# Altium footprint library 1.10-电容.PcbLib: 186 footprints (part 9 of 12)
Each footprint in its own frame and in the unit in brackets; x right, y up, seen from the top. Pads: shape width x height; smd on the part's side, far side on the other; paste and mask are expansions set on the pad; w line width, h text height; cw(c..) or ccw(c..) is an arc to the next point about the centre after c.
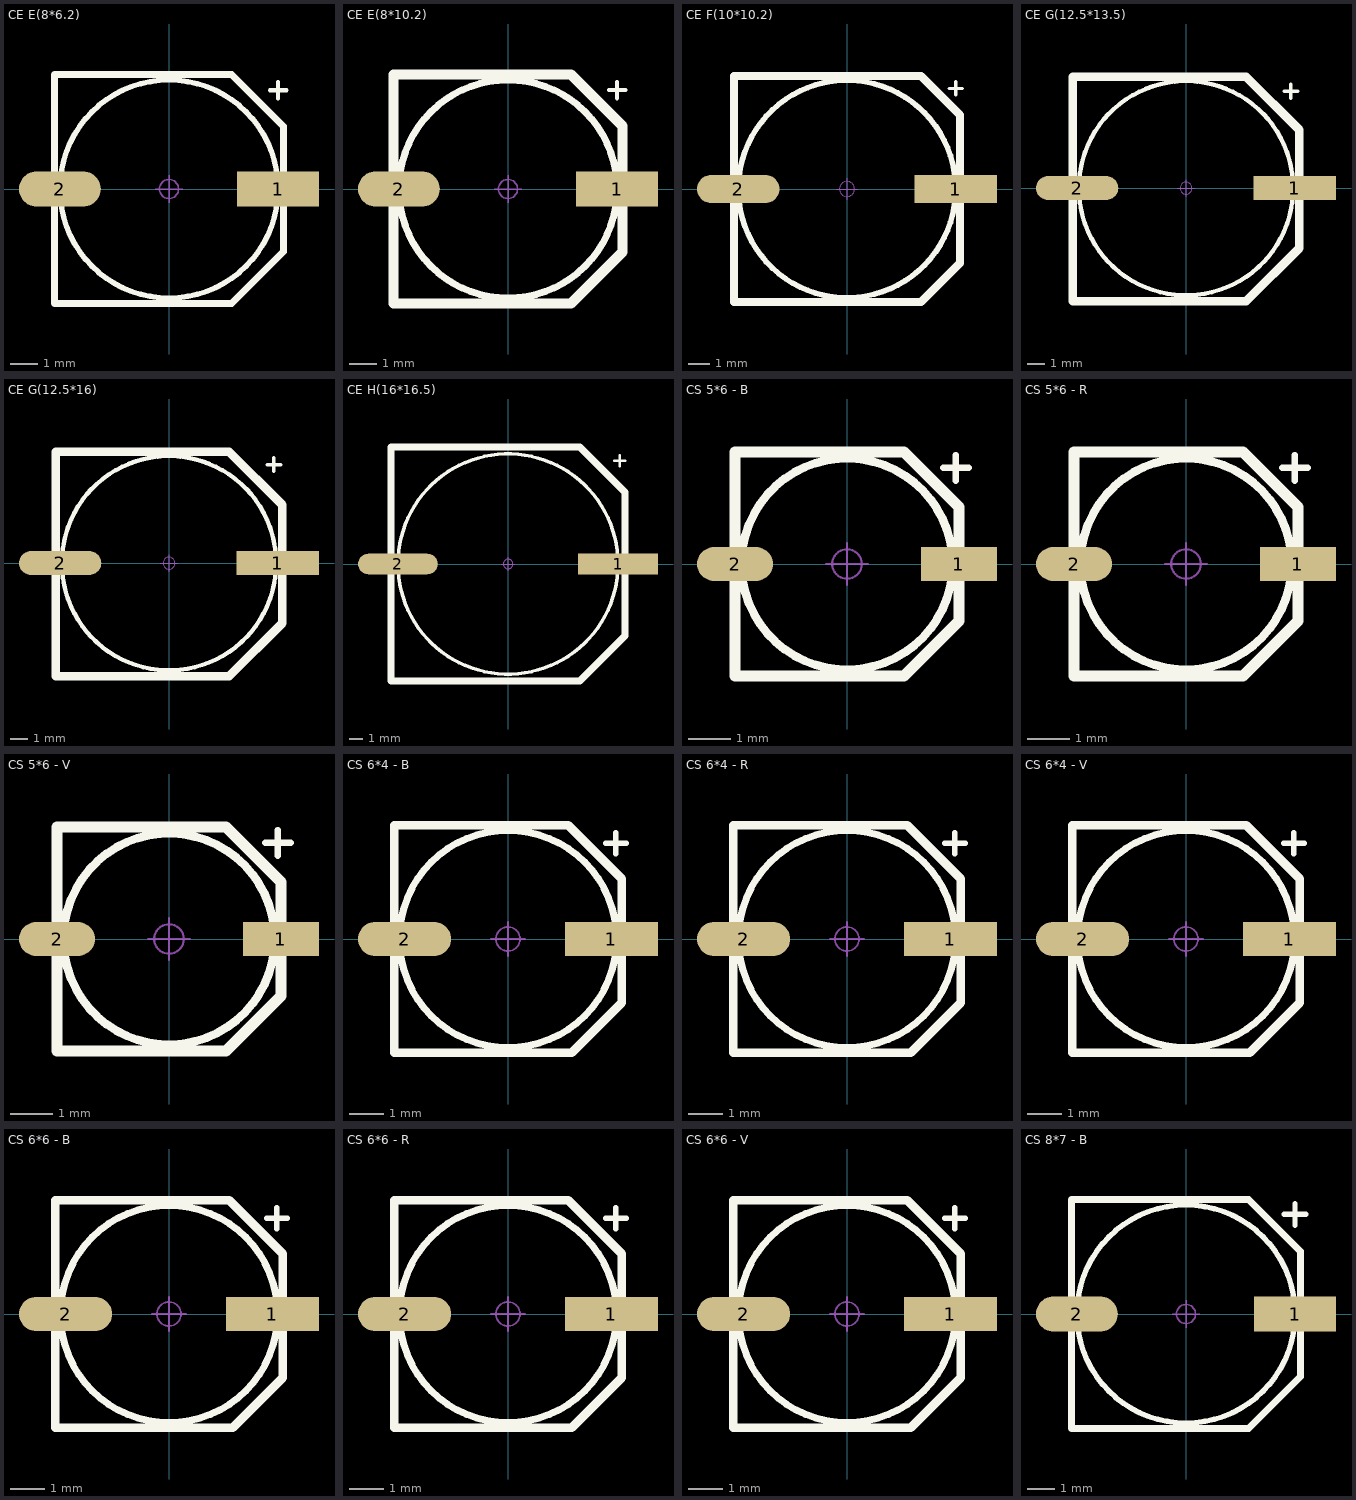
[diagram p8: the footprints below, top view; thin cyan lines are the x and y axes]

## CE E(8*6.2) [mm] "贴片电解电容，直径8mm，高6.2mm      [ PCB学习群514746572 ]"
pads (2):
  rect 3x1.3 smd: 1(4,0)
  oval 3x1.3 smd: 2(-4,0)
Top Overlay:
  circle w0.2: c0,0 r4
  lines w0.152: 3.704,3.623 4.304,3.623 ; 4,3.323 4,3.927
  lines w0.254: -4.2,-4.2 -4.2,4.2 2.3,4.2 4.2,2.3 4.2,-2.3 2.3,-4.2 -4.2,-4.2
Mechanical 15:
  circle w0.05: c0,0 r0.35
  lines w0.05: -0.5,0 0.5,0 ; 0,-0.5 0,0.5
3D body "CE_SMD_e_8x6_2.STEP": height 6.25, standoff 0.04, extent -4.5,-4.15 4.5,4.15

## CE E(8*10.2) [mm] "贴片电解电容，直径8mm，高10.2mm      [ PCB学习群514746572 ]"
pads (2):
  rect 3x1.3 smd: 1(4,0)
  oval 3x1.3 smd: 2(-4,0)
Top Overlay:
  circle w0.254: c0,0 r4
  lines w0.152: 3.704,3.625 4.304,3.625 ; 4,3.325 4,3.929
  lines w0.381: -4.2,-4.2 -4.2,4.2 2.3,4.2 4.2,2.3 4.2,-2.3 2.3,-4.2 -4.2,-4.2
Mechanical 15:
  circle w0.05: c0,0 r0.35
  lines w0.05: -0.5,0 0.5,0 ; 0,-0.5 0,0.5
3D body "CE_SMD_e_8x10_2.STEP": height 10.25, standoff 0.04, extent -4.5,-4.15 4.5,4.15

## CE F(10*10.2) [mm] "贴片电解电容，直径10mm，高10.2mm      [ PCB学习群514746572 ]"
pads (2):
  rect 3.8x1.3 smd: 1(5,0)
  oval 3.8x1.3 smd: 2(-5,0)
Top Overlay:
  circle w0.254: c0,0 r5
  lines w0.152: 4.704,4.625 5.304,4.625 ; 5,4.325 5,4.929
  lines w0.381: 5.191,-3.413 3.404,-5.2 -5.2,-5.2 -5.2,5.2 3.404,5.2 5.2,3.404 5.2,-3.404
Mechanical 15:
  circle w0.05: c0,0 r0.35
  lines w0.05: -0.5,0 0.5,0 ; 0,-0.5 0,0.5
3D body "CE_SMD_f_10x10_2.STEP": height 10.28, standoff 0.07, extent -5.8,-5.15 5.8,5.15

## CE G(12.5*13.5) [mm] "贴片电解电容，直径12.5mm，高13.5mm      [ PCB学习群514746572 ]"
pads (2):
  rect 4.8x1.4 smd: 1(6.35,0)
  oval 4.8x1.4 smd: 2(-6.35,0)
Top Overlay:
  circle w0.254: c0,0 r6.25
  lines w0.2: 5.725,5.65 6.525,5.65 ; 6.121,5.25 6.121,6.05
  lines w0.508: -6.6,-6.6 -6.6,6.5 3.5,6.5 6.6,3.4 6.6,-3.5 3.5,-6.6 -6.6,-6.6
Mechanical 15:
  circle w0.05: c0,0 r0.35
  lines w0.05: -0.5,0 0.5,0 ; 0,-0.5 0,0.5
3D body "CE_SMD_g_12_5x13_5.STEP": height 13.58, standoff 0.07, extent -7.15,-6.5 7.15,6.5

## CE G(12.5*16) [mm] "贴片电解电容，直径12.5mm，高16mm      [ PCB学习群514746572 ]"
pads (2):
  rect 4.8x1.4 smd: 1(6.35,0)
  oval 4.8x1.4 smd: 2(-6.35,0)
Top Overlay:
  circle w0.254: c0,0 r6.25
  lines w0.2: 5.725,5.75 6.525,5.75 ; 6.121,5.35 6.121,6.15
  lines w0.508: -6.6,-6.6 -6.6,6.5 3.5,6.5 6.6,3.4 6.6,-3.5 3.5,-6.6 -6.6,-6.6
Mechanical 15:
  circle w0.05: c0,0 r0.35
  lines w0.05: -0.5,0 0.5,0 ; 0,-0.5 0,0.5
3D body "CE_SMD_g_12_5x16.STEP": height 16.08, standoff 0.07, extent -7.15,-6.5 7.15,6.5

## CE H(16*16.5) [mm] "贴片电解电容，直径16mm，高16.5mm      [ PCB学习群514746572 ]"
pads (2):
  rect 5.8x1.5 smd: 1(8.001,0)
  oval 5.8x1.5 smd: 2(-8.001,0)
Top Overlay:
  circle w0.254: c0,0 r8
  lines w0.2: 7.725,7.5 8.525,7.5 ; 8.121,7.1 8.121,7.9
  lines w0.508: -8.5,-8.5 5.216,-8.5 8.5,-5.216 8.5,5.216 5.216,8.5 -8.5,8.5 -8.5,-8.5
Mechanical 15:
  circle w0.05: c0,0 r0.35
  lines w0.05: -0.5,0 0.5,0 ; 0,-0.5 0,0.5
3D body "CE_SMD_h_16x16_5.STEP": height 16.58, standoff 0.07, extent -9.4,-8.5 9.4,8.5

## CS 5*6 - B [mm] "直径5mm，高6mm      [ PCB学习群514746572 ]"
pads (2):
  rect 1.8x0.8 smd: 1(2.65,0)
  oval 1.8x0.8 smd: 2(-2.65,0)
Top Overlay:
  circle w0.2: c0,0 r2.5
  lines w0.152: 2.279,2.275 2.879,2.275 ; 2.575,1.975 2.575,2.579
  lines w0.254: -2.65,-2.65 1.35,-2.65 2.65,-1.35 2.65,1.35 1.35,2.65 -2.65,2.65 -2.65,-2.65
Mechanical 15:
  circle w0.05: c0,0 r0.35
  lines w0.05: -0.5,0 0.5,0 ; 0,-0.5 0,0.5
3D body "CS_SMD_5x6-B.STEP": height 6.05, standoff 0.04, extent -2.95,-2.65 2.95,2.65

## CS 5*6 - R [mm] "直径5mm，高6mm      [ PCB学习群514746572 ]"
pads (2):
  rect 1.8x0.8 smd: 1(2.65,0)
  oval 1.8x0.8 smd: 2(-2.65,0)
Top Overlay:
  circle w0.2: c0,0 r2.5
  lines w0.152: 2.279,2.275 2.879,2.275 ; 2.575,1.975 2.575,2.579
  lines w0.254: -2.65,-2.65 1.35,-2.65 2.65,-1.35 2.65,1.35 1.35,2.65 -2.65,2.65 -2.65,-2.65
Mechanical 15:
  circle w0.05: c0,0 r0.35
  lines w0.05: -0.5,0 0.5,0 ; 0,-0.5 0,0.5
3D body "CS_SMD_5x6-R.STEP": height 6.05, standoff 0.04, extent -2.95,-2.65 2.95,2.65

## CS 5*6 - V [mm] "直径5mm，高6mm      [ PCB学习群514746572 ]"
pads (2):
  rect 1.8x0.8 smd: 1(2.65,0)
  oval 1.8x0.8 smd: 2(-2.65,0)
Top Overlay:
  circle w0.2: c0,0 r2.5
  lines w0.152: 2.279,2.275 2.879,2.275 ; 2.575,1.975 2.575,2.579
  lines w0.254: -2.65,-2.65 1.35,-2.65 2.65,-1.35 2.65,1.35 1.35,2.65 -2.65,2.65 -2.65,-2.65
Mechanical 15:
  circle w0.05: c0,0 r0.35
  lines w0.05: -0.5,0 0.5,0 ; 0,-0.5 0,0.5
3D body "CS_SMD_5x6-P.STEP": height 6.05, standoff 0.04, extent -2.95,-2.65 2.95,2.65

## CS 6*4 - B [mm] "直径6mm，高4mm      [ PCB学习群514746572 ]"
pads (2):
  rect 2.7x1 smd: 1(3,0)
  oval 2.7x1 smd: 2(-3,0)
Top Overlay:
  circle w0.2: c0,0 r3.15
  lines w0.152: 2.829,2.775 3.429,2.775 ; 3.125,2.475 3.125,3.079
  lines w0.254: -3.3,-3.3 1.85,-3.3 3.3,-1.85 3.3,1.75 1.75,3.3 -3.3,3.3 -3.3,-3.3
Mechanical 15:
  circle w0.05: c0,0 r0.35
  lines w0.05: -0.5,0 0.5,0 ; 0,-0.5 0,0.5
3D body "CS_SMD_6x4-B.STEP": height 4.05, standoff 0.04, extent -3.5,-3.15 3.5,3.15

## CS 6*4 - R [mm] "直径6mm，高4mm      [ PCB学习群514746572 ]"
pads (2):
  rect 2.7x1 smd: 1(3,0)
  oval 2.7x1 smd: 2(-3,0)
Top Overlay:
  circle w0.2: c0,0 r3.15
  lines w0.152: 2.829,2.775 3.429,2.775 ; 3.125,2.475 3.125,3.079
  lines w0.254: -3.3,-3.3 1.85,-3.3 3.3,-1.85 3.3,1.75 1.75,3.3 -3.3,3.3 -3.3,-3.3
Mechanical 15:
  circle w0.05: c0,0 r0.35
  lines w0.05: -0.5,0 0.5,0 ; 0,-0.5 0,0.5
3D body "CS_SMD_6x4-R.STEP": height 4.05, standoff 0.04, extent -3.5,-3.15 3.5,3.15

## CS 6*4 - V [mm] "直径6mm，高4mm      [ PCB学习群514746572 ]"
pads (2):
  rect 2.7x1 smd: 1(3,0)
  oval 2.7x1 smd: 2(-3,0)
Top Overlay:
  circle w0.2: c0,0 r3.15
  lines w0.152: 2.829,2.775 3.429,2.775 ; 3.125,2.475 3.125,3.079
  lines w0.254: -3.3,-3.3 -3.3,3.3 1.75,3.3 3.3,1.75 3.3,-1.85 1.85,-3.3 -3.3,-3.3
Mechanical 15:
  circle w0.05: c0,0 r0.35
  lines w0.05: -0.5,0 0.5,0 ; 0,-0.5 0,0.5
3D body "CS_SMD_6x4-P.STEP": height 4.05, standoff 0.04, extent -3.5,-3.15 3.5,3.15

## CS 6*6 - B [mm] "直径6mm，高6mm      [ PCB学习群514746572 ]"
pads (2):
  rect 2.7x1 smd: 1(3,0)
  oval 2.7x1 smd: 2(-3,0)
Top Overlay:
  circle w0.2: c0,0 r3.15
  lines w0.152: 2.829,2.775 3.429,2.775 ; 3.125,2.475 3.125,3.079
  lines w0.254: -3.3,-3.3 1.85,-3.3 3.3,-1.85 3.3,1.75 1.75,3.3 -3.3,3.3 -3.3,-3.3
Mechanical 15:
  circle w0.05: c0,0 r0.35
  lines w0.05: -0.5,0 0.5,0 ; 0,-0.5 0,0.5
3D body "CS_SMD_6x6-B.STEP": height 6.05, standoff 0.04, extent -3.5,-3.15 3.5,3.15

## CS 6*6 - R [mm] "直径6mm，高6mm      [ PCB学习群514746572 ]"
pads (2):
  rect 2.7x1 smd: 1(3,0)
  oval 2.7x1 smd: 2(-3,0)
Top Overlay:
  circle w0.2: c0,0 r3.15
  lines w0.152: 2.829,2.775 3.429,2.775 ; 3.125,2.475 3.125,3.079
  lines w0.254: -3.3,-3.3 -3.3,3.3 1.75,3.3 3.3,1.75 3.3,-1.85 1.85,-3.3 -3.3,-3.3
Mechanical 15:
  circle w0.05: c0,0 r0.35
  lines w0.05: -0.5,0 0.5,0 ; 0,-0.5 0,0.5
3D body "CS_SMD_6x6-R.STEP": height 6.05, standoff 0.04, extent -3.5,-3.15 3.5,3.15

## CS 6*6 - V [mm] "直径6mm，高6mm      [ PCB学习群514746572 ]"
pads (2):
  rect 2.7x1 smd: 1(3,0)
  oval 2.7x1 smd: 2(-3,0)
Top Overlay:
  circle w0.2: c0,0 r3.15
  lines w0.152: 2.829,2.775 3.429,2.775 ; 3.125,2.475 3.125,3.079
  lines w0.254: -3.3,-3.3 1.85,-3.3 3.3,-1.85 3.3,1.75 1.75,3.3 -3.3,3.3 -3.3,-3.3
Mechanical 15:
  circle w0.05: c0,0 r0.35
  lines w0.05: -0.5,0 0.5,0 ; 0,-0.5 0,0.5
3D body "CS_SMD_6x6-P.STEP": height 6.05, standoff 0.04, extent -3.5,-3.15 3.5,3.15

## CS 8*7 - B [mm] "直径8mm，高7mm      [ PCB学习群514746572 ]"
pads (2):
  rect 3x1.3 smd: 1(4,0)
  oval 3x1.3 smd: 2(-4,0)
Top Overlay:
  circle w0.2: c0,0 r4
  lines w0.2: 3.6,3.65 4.4,3.65 ; 3.996,3.25 3.996,4.05
  lines w0.254: -4.2,-4.2 2.3,-4.2 4.2,-2.3 4.2,2.3 2.3,4.2 -4.2,4.2 -4.2,-4.2
Mechanical 15:
  circle w0.05: c0,0 r0.35
  lines w0.05: -0.5,0 0.5,0 ; 0,-0.5 0,0.5
3D body "CS_SMD_8x7-B.STEP": height 7.05, standoff 0.04, extent -4.5,-4.15 4.5,4.15